# Altium footprint library Sigma_Library.PcbLib: 125 footprints (part 4 of 8)
Each footprint in its own frame and in the unit in brackets; x right, y up, seen from the top. Pads: shape width x height; smd on the part's side, far side on the other; paste and mask are expansions set on the pad; w line width, h text height; cw(c..) or ccw(c..) is an arc to the next point about the centre after c.
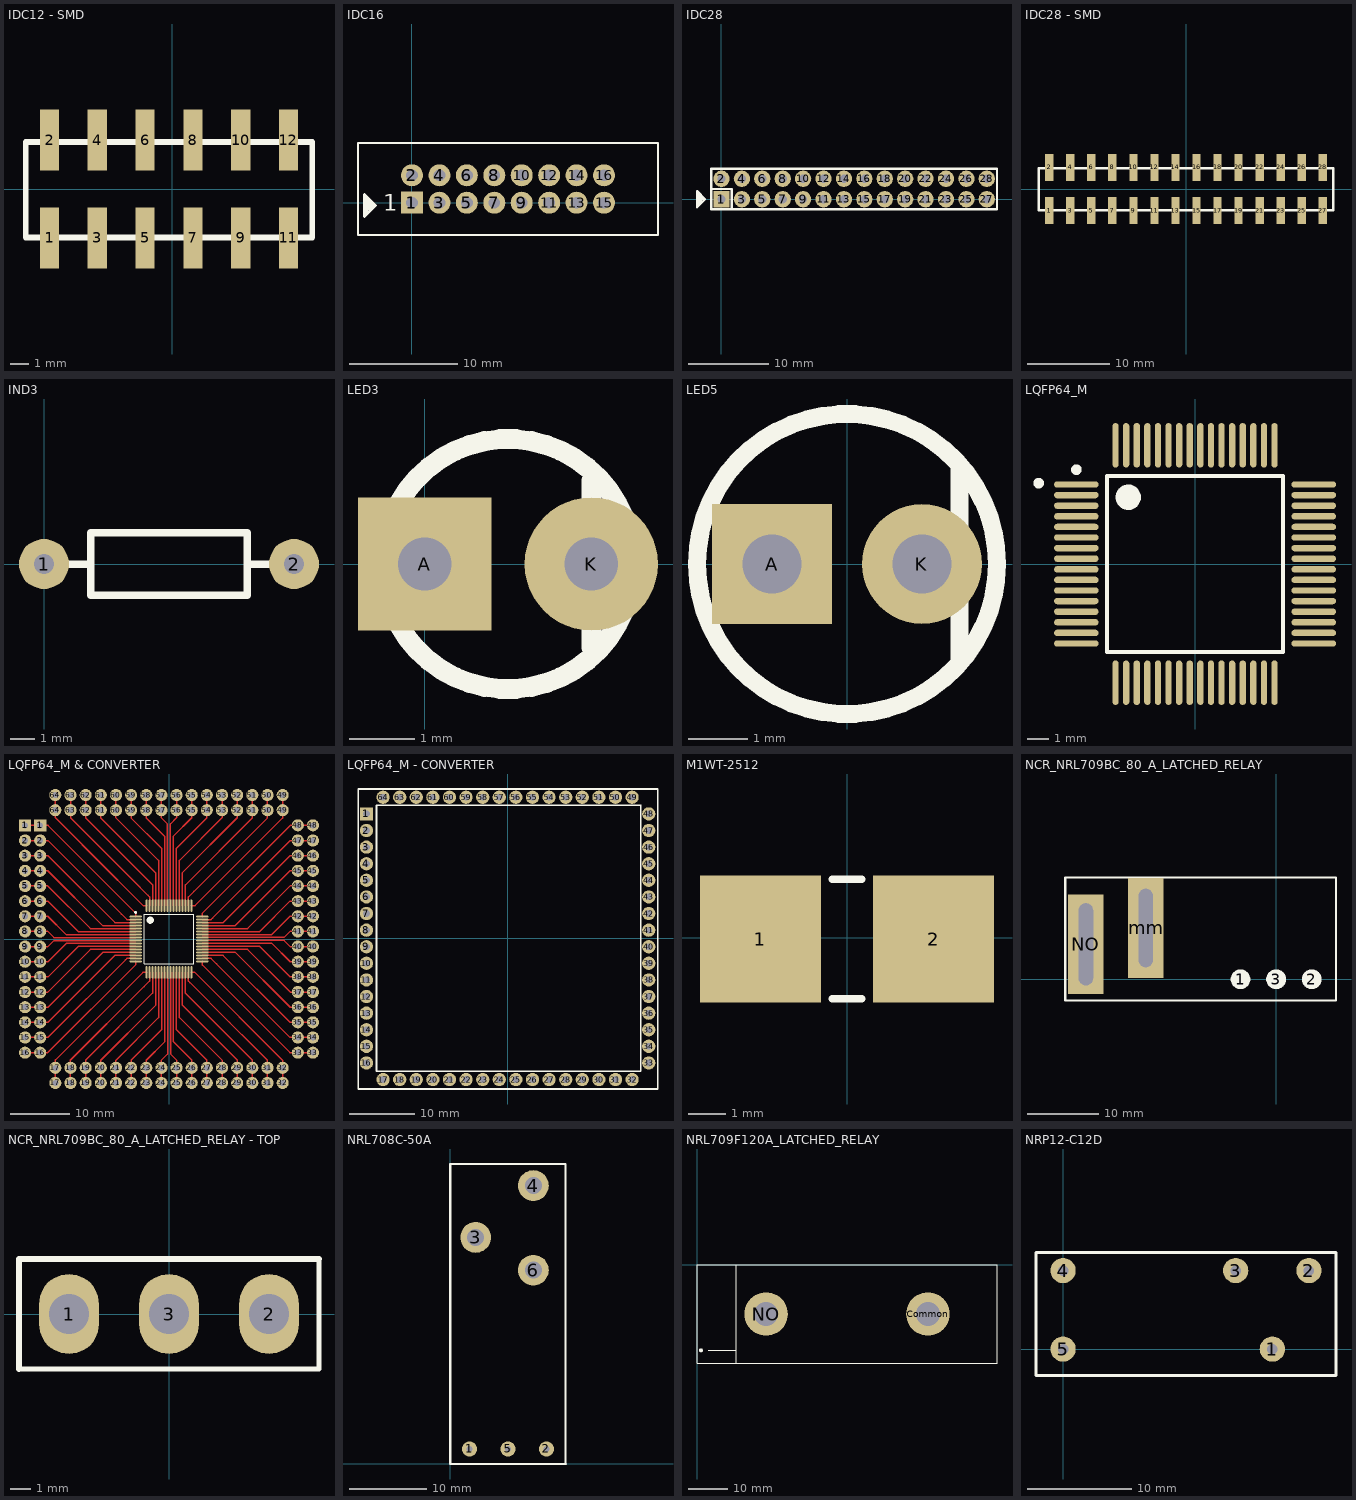
[diagram p3: the footprints below, top view; thin cyan lines are the x and y axes]

## IDC12 - SMD [mm]
pads (12):
  rect 1.02x3.25 smd: 1(-6.53,-2.603) 2(-6.53,2.603) 3(-3.99,-2.603) 4(-3.99,2.603) 5(-1.45,-2.603) 6(-1.45,2.603) 7(1.09,-2.603) 8(1.09,2.603) 9(3.63,-2.603) 10(3.63,2.603) 11(6.17,-2.603) 12(6.17,2.603)
Top Overlay:
  lines w0.305: -7.8,-2.581 -7.8,2.499 7.44,2.499 7.44,-2.581 -7.8,-2.581
3D body "c-5-146492-6-c-3d.stp": height 1.75, standoff -19, extent -7.544,-2.184 7.29,2.692

## IDC16 [mil]
pads (16):
  rect 80x80 hole 43.31: 1(0,0)
  round 80 hole 43.31: 2(0,100) 3(100,0) 4(100,100) 5(200,0) 6(200,100) 7(300,0) 8(300,100) 9(400,0) 10(400,100) 11(500,0) 12(500,100) 13(600,0) 14(600,100) 15(700,0) 16(700,100)
Top Overlay:
  lines w7.87: -196.85,-118.11 -196.85,218.11 896.85,218.11 896.85,-118.11 -196.85,-118.11
  lines w10: -163.11,-35 -163.11,15 ; -153.11,-25 -153.11,5 ; -143.11,-15 -143.11,-5 ; -173.11,-50 -133.11,-10 -173.11,30 -173.11,-50
  text "1" at -105,-30 h60
3D body "DS1013-16SSiB.stp": height 366.14, standoff -122.05, extent -205.51,-123.22 905.52,235.04

## IDC28 [mil]
pads (28):
  rect 80x80 hole 40: 1(0,0)
  round 80 hole 40: 2(0,100) 3(100,0) 4(100,100) 5(200,0) 6(200,100) 7(300,0) 8(300,100) 9(400,0) 10(400,100) 11(500,0) 12(500,100) 13(600,0) 14(600,100) 15(700,0) 16(700,100) 17(800,0) 18(800,100) 19(900,0) 20(900,100) 21(1000,0) 22(1000,100) 23(1100,0) 24(1100,100) 25(1200,0) 26(1200,100) 27(1300,0) 28(1300,100)
Top Overlay:
  lines w10: -110,-25 -110,25 ; -100,-15 -100,15 ; -90,-5 -90,5 ; -120,-40 -80,0 -120,40 -120,-40
  lines w12: -50,50 50,50 50,-50 ; -50,-50 1350,-50 1350,150 -50,150 -50,-50

## IDC28 - SMD [mm]
pads (28):
  rect 1.02x3.25 smd: 1(-16.51,-2.603) 2(-16.51,2.603) 3(-13.97,-2.603) 4(-13.97,2.603) 5(-11.43,-2.603) 6(-11.43,2.603) 7(-8.89,-2.603) 8(-8.89,2.603) 9(-6.35,-2.603) 10(-6.35,2.603) 11(-3.81,-2.603) 12(-3.81,2.603) 13(-1.27,-2.603) 14(-1.27,2.603) 15(1.27,-2.603) 16(1.27,2.603) 17(3.81,-2.603) 18(3.81,2.603) 19(6.35,-2.603) 20(6.35,2.603) 21(8.89,-2.603) 22(8.89,2.603) 23(11.43,-2.603) 24(11.43,2.603) 25(13.97,-2.603) 26(13.97,2.603) 27(16.51,-2.603) 28(16.51,2.603)
Top Overlay:
  lines w0.305: -17.78,-2.581 -17.78,2.499 17.78,2.499 17.78,-2.581 -17.78,-2.581
3D body "c-1-146492-4-c-3d.stp": height 19, standoff -1.75, extent -17.196,-2.438 17.958,2.439

## IND3 [mil]
pads (2):
  round 80 hole 32: 1(0,0) 2(400,0)
Top Overlay:
  lines w12: 0,0 75,0 ; 325,0 400,0 ; 75,-50 325,-50 325,50 75,50 75,-50
3D body "RES-0.25W-H-CF.stp": height 106.3, standoff -98.43, extent -10.82,-50.18 410.74,52.18

## LED3 [mil]
pads (2):
  rect 80x80 hole 32: A(0,0)
  round 80 hole 32: K(100,0)
Top Overlay:
  circle w12: c50,0 r75
  lines w12: 100,-50 100,50
3D body "LED_D3.0mm_RED.step": height 208.66, standoff -236.22, extent -25.59,-75.58 109.85,75.58

## LED5 [mil]
pads (2):
  rect 80x80 hole 39.37: A(-50,0)
  round 80 hole 39.37: K(50,0)
Top Overlay:
  circle w12: c0,0 r100
  lines w12: 75,-64 75,64
3D body "LED_gelb.step": height 354.33, standoff -1102.36, extent -108.27,-108.27 108.26,108.26

## LQFP64_M [mm] "Thin QFP, 64-Leads, Body 10x10mm, Pitch 0.5mm, IPC Low Density"
height 1.6
pads (64):
  oval 2.1x0.3 smd: 1(-5.6,3.75) 2(-5.6,3.25) 3(-5.6,2.75) 4(-5.6,2.25) 5(-5.6,1.75) 6(-5.6,1.25) 7(-5.6,0.75) 8(-5.6,0.25) 9(-5.6,-0.25) 10(-5.6,-0.75) 11(-5.6,-1.25) 12(-5.6,-1.75) 13(-5.6,-2.25) 14(-5.6,-2.75) 15(-5.6,-3.25) 16(-5.6,-3.75) 33(5.6,-3.75) 34(5.6,-3.25) 35(5.6,-2.75) 36(5.6,-2.25) 37(5.6,-1.75) 38(5.6,-1.25) 39(5.6,-0.75) 40(5.6,-0.25) 41(5.6,0.25) 42(5.6,0.75) 43(5.6,1.25) 44(5.6,1.75) 45(5.6,2.25) 46(5.6,2.75) 47(5.6,3.25) 48(5.6,3.75)
  oval 0.3x2.1 smd: 17(-3.75,-5.6) 18(-3.25,-5.6) 19(-2.75,-5.6) 20(-2.25,-5.6) 21(-1.75,-5.6) 22(-1.25,-5.6) 23(-0.75,-5.6) 24(-0.25,-5.6) 25(0.25,-5.6) 26(0.75,-5.6) 27(1.25,-5.6) 28(1.75,-5.6) 29(2.25,-5.6) 30(2.75,-5.6) 31(3.25,-5.6) 32(3.75,-5.6) 49(3.75,5.6) 50(3.25,5.6) 51(2.75,5.6) 52(2.25,5.6) 53(1.75,5.6) 54(1.25,5.6) 55(0.75,5.6) 56(0.25,5.6) 57(-0.25,5.6) 58(-0.75,5.6) 59(-1.25,5.6) 60(-1.75,5.6) 61(-2.25,5.6) 62(-2.75,5.6) 63(-3.25,5.6) 64(-3.75,5.6)
Top Overlay:
  circle w0.6: c-3.15,3.15 r0.3
  circle w0.25: c-5.6,4.45 r0.125
  circle w0.25: c-7.378,3.815 r0.125
  lines w0.2: -4.15,-4.15 4.15,-4.15 4.15,4.15 -4.15,4.15 -4.15,-4.15
3D body: height 10, standoff 0, extent -4.191,-4.191 4.191,4.191

## LQFP64_M & CONVERTER [mil] "Arm_With_Converter"
pads (192):
  rect 80x80 hole 40: 1(-950,750) 1(-850,750)
  oval 82.68x11.81 smd: 1(-220.47,147.64) 2(-220.47,127.95) 3(-220.47,108.27) 4(-220.47,88.58) 5(-220.47,68.9) 6(-220.47,49.21) 7(-220.47,29.53) 8(-220.47,9.84) 9(-220.47,-9.84) 10(-220.47,-29.53) 11(-220.47,-49.21) 12(-220.47,-68.9) 13(-220.47,-88.58) 14(-220.47,-108.27) 15(-220.47,-127.95) 16(-220.47,-147.64) 33(220.47,-147.64) 34(220.47,-127.95) 35(220.47,-108.27) 36(220.47,-88.58) 37(220.47,-68.9) 38(220.47,-49.21) 39(220.47,-29.53) 40(220.47,-9.84) 41(220.47,9.84) 42(220.47,29.53) 43(220.47,49.21) 44(220.47,68.9) 45(220.47,88.58) 46(220.47,108.27) 47(220.47,127.95) 48(220.47,147.64)
  round 80 hole 40: 2(-950,650) 2(-850,650) 3(-950,550) 3(-850,550) 4(-950,450) 4(-850,450) 5(-950,350) 5(-850,350) 6(-950,250) 6(-850,250) 7(-950,150) 7(-850,150) 8(-950,50) 8(-850,50) 9(-950,-50) 9(-850,-50) 10(-950,-150) 10(-850,-150) 11(-950,-250) 11(-850,-250) 12(-950,-350) 12(-850,-350) 13(-950,-450) 13(-850,-450) 14(-950,-550) 14(-850,-550) 15(-950,-650) 15(-850,-650) 16(-950,-750) 16(-850,-750) 17(-750,-950) 17(-750,-850) 18(-650,-950) 18(-650,-850) 19(-550,-950) 19(-550,-850) 20(-450,-950) 20(-450,-850) 21(-350,-950) 21(-350,-850) 22(-250,-950) 22(-250,-850) 23(-150,-950) 23(-150,-850) 24(-50,-950) 24(-50,-850) 25(50,-950) 25(50,-850) 26(150,-950) 26(150,-850) 27(250,-950) 27(250,-850) 28(350,-950) 28(350,-850) 29(450,-950) 29(450,-850) 30(550,-950) 30(550,-850) 31(650,-950) 31(650,-850) 32(750,-950) 32(750,-850) 33(850,-750) 33(950,-750) 34(850,-650) 34(950,-650) 35(850,-550) 35(950,-550) 36(850,-450) 36(950,-450) 37(850,-350) 37(950,-350) 38(850,-250) 38(950,-250) 39(850,-150) 39(950,-150) 40(850,-50) 40(950,-50) 41(850,50) 41(950,50) 42(850,150) 42(950,150) 43(850,250) 43(950,250) 44(850,350) 44(950,350) 45(850,450) 45(950,450) 46(850,550) 46(950,550) 47(850,650) 47(950,650) 48(850,750) 48(950,750) 49(750,850) 49(750,950) 50(650,850) 50(650,950) 51(550,850) 51(550,950) 52(450,850) 52(450,950) 53(350,850) 53(350,950) 54(250,850) 54(250,950) 55(150,850) 55(150,950) 56(50,850) 56(50,950) 57(-50,850) 57(-50,950) 58(-150,850) 58(-150,950) 59(-250,850) 59(-250,950) 60(-350,850) 60(-350,950) 61(-450,850) 61(-450,950) 62(-550,850) 62(-550,950) 63(-650,850) 63(-650,950) 64(-750,850) 64(-750,950)
  oval 11.81x82.68 smd: 17(-147.64,-220.47) 18(-127.95,-220.47) 19(-108.27,-220.47) 20(-88.58,-220.47) 21(-68.9,-220.47) 22(-49.21,-220.47) 23(-29.53,-220.47) 24(-9.84,-220.47) 25(9.84,-220.47) 26(29.53,-220.47) 27(49.21,-220.47) 28(68.9,-220.47) 29(88.58,-220.47) 30(108.27,-220.47) 31(127.95,-220.47) 32(147.64,-220.47) 49(147.64,220.47) 50(127.95,220.47) 51(108.27,220.47) 52(88.58,220.47) 53(68.9,220.47) 54(49.21,220.47) 55(29.53,220.47) 56(9.84,220.47) 57(-9.84,220.47) 58(-29.53,220.47) 59(-49.21,220.47) 60(-68.9,220.47) 61(-88.58,220.47) 62(-108.27,220.47) 63(-127.95,220.47) 64(-147.64,220.47)
Top Layer:
  lines w10: -950,-750 -850,-750 -799.61,-750 -220.47,-170.87 -220.47,-147.64 ; -950,-650 -850,-650 -800,-650 -277.95,-127.95 ; -950,-550 -850,-550 -799.21,-550 -357.48,-108.27 -220.47,-108.27 ; -950,-450 -850,-450 -798.43,-450 -437.01,-88.58 -220.47,-88.58 ; -950,-350 -850,-350 -799.21,-350 -518.11,-68.9 -220.47,-68.9 ; -950,-250 -850,-250 -799.21,-250 -598.43,-49.21 -220.47,-49.21 ; -950,-150 -850,-150 -798.82,-150 -678.35,-29.53 -220.47,-29.53 ; -950,150 -850,150 -800,150 -679.53,29.53 -220.47,29.53 ; -950,250 -850,250 -800,250 -599.21,49.21 -220.47,49.21 ; -950,350 -850,350 -800,350 -518.9,68.9 -220.47,68.9 ; -950,450 -850,450 -800,450 -438.58,88.58 -220.47,88.58 ; -950,550 -850,550 -798.82,550 -357.09,108.27 -220.47,108.27 ; -950,650 -850,650 -799.21,650 -313.78,164.57 -277.17,127.95 -220.47,127.95 ; -950,750 -850,750 -798.43,750 -220.47,172.05 -220.47,147.64 ; -750,-948.82 -750,-850 -750,-798.43 -172.05,-220.47 -147.64,-220.47 ; -750,950 -750,850 -750,799.61 ; -650,950.39 -650,950 -650,850 -650,800 ; -550,-950.79 -550,-798.82 -108.27,-357.09 -108.27,-220.47 ; -550,950 -550,850 -550,799.21 -108.27,357.48 -108.27,220.47 ; -450,-950.39 -450,-950 -450,-850 -450,-800 -88.58,-438.58 -88.58,-220.47 ; -450,950 -450,850 -450,798.43 -88.58,437.01 -88.58,220.47 ; -350,950 -350,850 -350,799.21 -68.9,518.11 -68.9,220.47 ; -287.8,-137.8 -277.95,-127.95 ; -250,-950.79 -250,-950 -250,-850 -250,-800.39 ; -250,-800 -49.21,-599.21 -49.21,-220.47 ; -250,950 -250,850 -250,799.21 -49.21,598.43 -49.21,220.47 ; -220.87,9.45 -759.05,9.45 -799.21,49.61 ; -150,-950.39 -150,-950 -150,-850 -150,-800 -29.53,-679.53 -29.53,-220.47 ; -150,950 -150,850 -150,798.82 -29.53,678.35 ; -147.64,220.47 -170.87,220.47 ; -127.95,-220.47 -127.95,-277.17 -164.57,-313.78 -651.18,-800.39 ; -127.95,220.47 -127.95,277.95 ; -68.9,-220.47 -68.9,-518.9 -351.18,-801.18 ; -50,950 -50.39,949.61 ; -45.28,694.09 -29.53,678.35 ; -29.53,220.47 -29.53,678.35 ; -9.84,220.47 -10.24,220.87 -10.24,759.06 -50.39,799.21 ; -9.45,-220.87 -9.45,-759.05 -49.61,-799.21 ; 9.84,220.47 9.45,220.87 9.45,759.06 ; 29.53,-220.47 29.53,-678.35 150,-798.82 150,-850 150,-949.21 ; 29.53,220.47 29.53,679.53 150,800 150,850 150,950 150,950.39 ; 49.21,-220.47 49.21,-598.43 248.82,-798.03 ; 49.21,220.47 49.21,599.21 250,800 250,850 250,950 250,950.39 ; 49.61,799.21 9.45,759.06 ; 50,-949.61 50,-850 50,-798.82 10.24,-759.06 ; 50,950 50,850 50,799.61 9.45,759.06 ; 68.9,-220.47 68.9,-518.11 350,-799.21 ; 68.9,220.47 68.9,518.9 350,800 350,850 350,950 350,950.39 ; 88.58,-220.47 88.58,-437.01 450,-798.43 450,-850 450,-948.82 ; 88.58,220.47 88.58,438.58 450,800 450,850 450,950 450,950.39 ; 108.27,-220.47 108.27,-357.48 548.82,-798.03 ; 108.27,220.47 108.27,357.09 550,798.82 550,850 550,949.21 ; 127.95,220.47 127.95,277.17 164.57,313.78 650,799.21 650,850 650,949.61 ; 147.64,-220.47 170.87,-220.47 750,-799.61 750,-850 750,-950 ; 147.64,220.47 172.05,220.47 750,798.43 750,850 750,948.82 ; 220.47,-147.64 220.47,-172.05 798.43,-750 850,-750 948.82,-750 ; 220.47,-127.95 277.17,-127.95 313.78,-164.57 799.21,-650 850,-650 949.61,-650 ; 220.47,-108.27 357.09,-108.27 798.82,-550 850,-550 949.21,-550 ; 220.47,-88.58 438.58,-88.58 800,-450 850,-450 950,-450 950.39,-450 ; 220.47,-68.9 518.9,-68.9 800,-350 850,-350 950,-350 950.39,-350 ; 220.47,-49.21 599.21,-49.21 800,-250 850,-250 950,-250 950.39,-250 ; 220.47,-29.53 679.53,-29.53 800,-150 850,-150 950,-150 950.39,-150 ; 220.47,29.53 678.35,29.53 798.82,150 850,150 949.21,150 ; 220.47,49.21 598.43,49.21 799.21,250 850,250 949.61,250 ; 220.47,68.9 518.11,68.9 799.21,350 850,350 949.61,350 ; 220.47,88.58 437.01,88.58 798.43,450 850,450 948.82,450 ; 220.47,108.27 357.48,108.27 799.21,550 850,550 949.61,550 ; 220.47,147.64 220.47,170.87 799.61,750 850,750 950,750 ; 220.87,-9.45 759.06,-9.45 799.21,-49.61 ; 287.8,137.8 277.95,127.95 ; 350,-949.21 350,-850 350,-799.21 ; 350,-798.82 350,-799.21 ; 650,-950.39 650,-950 650,-850 650,-800 ; 950.39,650 950,650 850,650 800,650 277.95,127.95 ; -950.39,49.61 -950,49.61 ; -950.39,49.61 -950,49.61 ; -950.39,49.61 -950,49.61 ; -950.39,49.61 -950,49.61 ; -950,49.61 -850,49.61 ; -950,49.61 -850,49.61 ; -950,49.61 -850,49.61 ; -950,49.61 -850,49.61 ; -949.61,-50.39 -850,-50.39 ; -949.61,-50.39 -850,-50.39 ; -949.61,-50.39 -850,-50.39 ; -949.61,-50.39 -850,-50.39 ; -850,-50.39 -799.21,-50.39 ; -850,-50.39 -799.21,-50.39 ; -850,-50.39 -799.21,-50.39 ; -850,-50.39 -799.21,-50.39 ; -850,49.61 -799.21,49.61 ; -850,49.61 -799.21,49.61 ; -850,49.61 -799.21,49.61 ; -850,49.61 -799.21,49.61 ; -799.21,-50.39 -759.06,-10.24 ; -759.06,-10.24 -220.47,-10.24 ; -759.06,-10.24 -220.47,-10.24 ; -759.06,-10.24 -220.08,-10.24 ; -759.06,-10.24 -220.47,-10.24 ; -750,799.61 -647.7,697.3 ; -750,799.61 -647.7,697.3 ; -750,799.61 -170.87,220.47 ; -750,799.61 -647.7,697.3 ; -651.18,-948.82 -651.18,-850 ; -651.18,-948.82 -651.18,-850 ; -651.18,-948.82 -651.18,-850 ; -651.18,-948.82 -651.18,-850 ; -651.18,-850 -651.18,-800.39 ; -651.18,-850 -651.18,-800.39 ; -651.18,-850 -651.18,-800.39 ; -651.18,-850 -651.18,-800.39 ; -650,800 -547.5,697.5 ; -650,800 -547.5,697.5 ; -650,800 -547.5,697.5 ; -650,800 -547.5,697.5 ; -647.7,697.3 -500.2,549.8 ; -647.7,697.3 -500.2,549.8 ; -647.7,697.3 -500.2,549.8 ; -547.5,697.5 -400,550 ; -547.5,697.5 -400,550 ; -547.5,697.5 -400,550 ; -547.5,697.5 -400,550 ; -500.2,549.8 -170.87,220.47 ; -500.2,549.8 -170.87,220.47 ; -500.2,549.8 -170.87,220.47 ; -400,550 -237.5,387.5 ; -400,550 -237.5,387.5 ; -400,550 -237.5,387.5 ; -400,550 -237.5,387.5 ; -351.18,-948.82 -351.18,-850 ; -351.18,-948.82 -351.18,-850 ; -351.18,-948.82 -351.18,-850 ; -351.18,-948.82 -351.18,-850 ; -351.18,-850 -351.18,-801.18 ; -351.18,-850 -351.18,-801.18 ; -351.18,-850 -351.18,-801.18 ; -351.18,-850 -351.18,-801.18 ; -277.95,-127.95 -220.47,-127.95 -277.95,-127.95 ; -237.5,387.5 -137.8,287.8 ; -237.5,387.5 -137.8,287.8 ; -237.5,387.5 -137.8,287.8 ; -237.5,387.5 -137.8,287.8 ; -220.47,-10.24 -220.08,-10.24 ; -220.47,-10.24 -220.08,-10.24 ; -220.47,-10.24 -220.08,-10.24 ; -137.8,287.8 -127.95,277.95 ; -137.8,287.8 -127.95,277.95 ; -50.39,799.21 -50.39,850 ; -50.39,799.21 -50.39,850 ; -50.39,799.21 -50.39,850 ; -50.39,799.21 -50.39,850 ; -50.39,850 -50.39,949.61 ; -50.39,850 -50.39,949.61 ; -50.39,850 -50.39,949.61 ; -50.39,850 -50.39,949.61 ; -49.61,-949.61 -49.61,-850 ; -49.61,-949.61 -49.61,-850 ; -49.61,-949.61 -49.61,-850 ; -49.61,-949.61 -49.61,-850 ; -49.61,-850 -49.61,-799.21 ; -49.61,-850 -49.61,-799.21 ; -49.61,-850 -49.61,-799.21 ; -49.61,-850 -49.61,-799.21 ; 10.24,-759.06 10.24,-220.47 ; 10.24,-759.06 10.24,-220.47 ; 10.24,-759.06 10.24,-220.47 ; 10.24,-759.06 10.24,-220.08 ; 10.24,-220.47 10.24,-220.08 ; 10.24,-220.47 10.24,-220.08 ; 10.24,-220.47 10.24,-220.08 ; 127.95,-277.95 127.95,-220.47 127.95,-277.95 ; 127.95,-277.95 137.8,-287.8 ; 127.95,-277.95 137.8,-287.8 ; 137.8,-287.8 400.2,-550.2 ; 137.8,-287.8 400.2,-550.2 ; 137.8,-287.8 400.2,-550.2 ; 137.8,-287.8 400.2,-550.2 ; 220.08,10.24 220.47,10.24 ; 220.08,10.24 220.47,10.24 ; 220.08,10.24 759.06,10.24 ; 220.08,10.24 220.47,10.24 ; 220.47,10.24 759.06,10.24 ; 220.47,10.24 759.06,10.24 ; 220.47,10.24 759.06,10.24 ; 248.82,-947.24 248.82,-850 ; 248.82,-947.24 248.82,-850 ; 248.82,-947.24 248.82,-850 ; 248.82,-947.24 248.82,-850 ; 248.82,-850 248.82,-798.03 ; 248.82,-850 248.82,-798.03 ; 248.82,-850 248.82,-798.03 ; 248.82,-850 248.82,-798.03 ; 277.95,127.95 220.47,127.95 277.95,127.95 ; 400.2,-550.2 555.2,-705.2 ; 400.2,-550.2 555.2,-705.2 ; 400.2,-550.2 555.2,-705.2 ; 400.2,-550.2 555.2,-705.2 ; 548.82,-948.42 548.82,-850 ; 548.82,-948.42 548.82,-850 ; 548.82,-948.42 548.82,-850 ; 548.82,-948.42 548.82,-798.03 ; 548.82,-850 548.82,-798.03 ; 548.82,-850 548.82,-798.03 ; 548.82,-850 548.82,-798.03 ; 555.2,-705.2 650,-800 ; 555.2,-705.2 650,-800 ; 555.2,-705.2 650,-800 ; 555.2,-705.2 650,-800 ; 759.06,10.24 799.21,50.39 ; 799.21,-49.61 850,-49.61 ; 799.21,-49.61 850,-49.61 ; 799.21,-49.61 850,-49.61 ; 799.21,-49.61 850,-49.61 ; 799.21,50.39 850,50.39 ; 799.21,50.39 850,50.39 ; 799.21,50.39 850,50.39 ; 799.21,50.39 850,50.39 ; 850,-49.61 949.61,-49.61 ; 850,-49.61 949.61,-49.61 ; 850,-49.61 949.61,-49.61 ; 850,-49.61 949.61,-49.61 ; 850,50.39 949.61,50.39 ; 850,50.39 949.61,50.39 ; 850,50.39 949.61,50.39 ; 850,50.39 949.61,50.39
Top Overlay:
  circle w23.62: c-124.02,124.02 r11.81
  circle w9.84: c-220.47,175.2 r4.92
  lines w7.87: -163.39,-163.39 163.39,-163.39 163.39,163.39 -163.39,163.39 -163.39,-163.39
3D body: height 393.7, standoff 0, extent -1008.46,-1003.94 -792.71,794.1
3D body: height 393.7, standoff 0, extent -1009.06,793.11 800,1008.86
3D body: height 393.7, standoff 0, extent 784.06,-816.54 999.8,1009.45
3D body: height 393.7, standoff 0, extent -812.99,-1007.87 996.06,-792.13
3D body: height 393.7, standoff 196.85, extent -795.06,-792.52 778.35,792.13

## LQFP64_M - CONVERTER [mil] "Arm_Converter"
height 21.65
pads (64):
  rect 80x80 hole 40: 1(-850,750)
  round 80 hole 40: 2(-850,650) 3(-850,550) 4(-850,450) 5(-850,350) 6(-850,250) 7(-850,150) 8(-850,50) 9(-850,-50) 10(-850,-150) 11(-850,-250) 12(-850,-350) 13(-850,-450) 14(-850,-550) 15(-850,-650) 16(-850,-750) 17(-750,-850) 18(-650,-850) 19(-550,-850) 20(-450,-850) 21(-350,-850) 22(-250,-850) 23(-150,-850) 24(-50,-850) 25(50,-850) 26(150,-850) 27(250,-850) 28(350,-850) 29(450,-850) 30(550,-850) 31(650,-850) 32(750,-850) 33(850,-750) 34(850,-650) 35(850,-550) 36(850,-450) 37(850,-350) 38(850,-250) 39(850,-150) 40(850,-50) 41(850,50) 42(850,150) 43(850,250) 44(850,350) 45(850,450) 46(850,550) 47(850,650) 48(850,750) 49(750,850) 50(650,850) 51(550,850) 52(450,850) 53(350,850) 54(250,850) 55(150,850) 56(50,850) 57(-50,850) 58(-150,850) 59(-250,850) 60(-350,850) 61(-450,850) 62(-550,850) 63(-650,850) 64(-750,850)
Top Overlay:
  lines w10: 803,802 -790,802 -790,-801 803,-801 803,802 ; 803,802 803,802 ; -900,-907 905,-907 905,899 904,900 -900,900 -900,-907
3D body "Header1x2.STEP": height 333.79, standoff -98.49, extent -895,600 -795,800
3D body "Header1x2.STEP": height 333.79, standoff -98.49, extent -895,400 -795,600
3D body "Header1x2.STEP": height 333.79, standoff -98.49, extent -895,0 -795,200
3D body "Header1x2.STEP": height 333.79, standoff -98.49, extent -895,200 -795,400
3D body "Header1x2.STEP": height 333.79, standoff -98.49, extent -895,-600 -795,-400
3D body "Header1x2.STEP": height 333.79, standoff -98.49, extent -895,-800 -795,-600
3D body "Header1x2.STEP": height 333.79, standoff -98.49, extent -895,-400 -795,-200
3D body "Header1x2.STEP": height 333.79, standoff -98.49, extent -895,-200 -795,0
3D body "Header1x2.STEP": height 333.79, standoff -98.49, extent 0,805 200,905
3D body "Header1x2.STEP": height 333.79, standoff -98.49, extent 200,805 400,905
3D body "Header1x2.STEP": height 333.79, standoff -98.49, extent 600,805 800,905
3D body "Header1x2.STEP": height 333.79, standoff -98.49, extent 400,805 600,905
3D body "Header1x2.STEP": height 333.79, standoff -98.49, extent -400,805 -200,905
3D body "Header1x2.STEP": height 333.79, standoff -98.49, extent -200,805 0,905
3D body "Header1x2.STEP": height 333.79, standoff -98.49, extent -600,805 -400,905
3D body "Header1x2.STEP": height 333.79, standoff -98.49, extent -800,805 -600,905
3D body "Header1x2.STEP": height 333.79, standoff -98.49, extent 805,-200 905,0
3D body "Header1x2.STEP": height 333.79, standoff -98.49, extent 805,-400 905,-200
3D body "Header1x2.STEP": height 333.79, standoff -98.49, extent 805,-800 905,-600
3D body "Header1x2.STEP": height 333.79, standoff -98.49, extent 805,-600 905,-400
3D body "Header1x2.STEP": height 333.79, standoff -98.49, extent 805,200 905,400
3D body "Header1x2.STEP": height 333.79, standoff -98.49, extent 805,0 905,200
3D body "Header1x2.STEP": height 333.79, standoff -98.49, extent 805,400 905,600
3D body "Header1x2.STEP": height 333.79, standoff -98.49, extent 805,600 905,800
3D body "Header1x2.STEP": height 333.79, standoff -98.49, extent -200,-905 0,-805
3D body "Header1x2.STEP": height 333.79, standoff -98.49, extent -400,-905 -200,-805
3D body "Header1x2.STEP": height 333.79, standoff -98.49, extent -800,-905 -600,-805
3D body "Header1x2.STEP": height 333.79, standoff -98.49, extent -600,-905 -400,-805
3D body "Header1x2.STEP": height 333.79, standoff -98.49, extent 200,-905 400,-805
3D body "Header1x2.STEP": height 333.79, standoff -98.49, extent 0,-905 200,-805
3D body "Header1x2.STEP": height 333.79, standoff -98.49, extent 400,-905 600,-805
3D body "Header1x2.STEP": height 333.79, standoff -98.49, extent 600,-905 800,-805

## M1WT-2512 [mm] "Power SMD Resistor"
pads (2):
  rect 3.25x3.4 smd: 1(-2.325,-0.029) 2(2.325,-0.029)
Top Overlay:
  lines w0.2: -0.4,-1.629 0.4,-1.629 ; -0.4,1.571 0.4,1.571

## NCR_NRL709BC_80_A_LATCHED_RELAY [mm]
pads (5):
  round 2.8 on Top Overlay: 1(-5,0) 2(5,0) 3(0,0)
  rect 5x14 hole 2 slot 11 at 90 deg: Common(-18.3,7.2)
  rect 5x14 hole 2 slot 11.5 at 90 deg: NO(-26.7,4.9)
Top Overlay:
  lines w0.254: -29.6,-3 8.4,-3 8.4,14.3
  lines w0.305: -29.6,-3 -29.6,14.3 8.4,14.3
3D body "NRL709BC-3D.STEP": height 30.16, standoff -9.34, extent -29.652,-2.896 8.348,14.104

## NCR_NRL709BC_80_A_LATCHED_RELAY - TOP [mm]
pads (3):
  oval 3x4 hole 2: 1(-5,0) 2(5,0) 3(0,0)
Top Overlay:
  lines w0.254: -7.5,-2.76 7.5,-2.76 7.5,2.76
  lines w0.305: -7.5,-2.76 -7.5,2.76 7.5,2.76

## NRL708C-50A [mm] "50 A latch relay pcb mount"
pads (6):
  round 2 hole 0.8: 1(2.5,1.95) 2(12.5,1.95) 5(7.5,1.95)
  round 4 hole 2.2: 3(3.3,29.45) 4(10.8,36.2) 6(10.8,25.2)
Top Overlay:
  lines w0.254: 0,39 15,39 15,0
  lines w0.305: 0,39 0,0 15,0
3D body "708C50A.STEP": height 31.02, standoff -4.88, extent 0.025,0 15.025,39

## NRL709F120A_LATCHED_RELAY [mm]
pads (2):
  round 11 hole 6: Common(58.5,-12.5) NO(17.5,-12.5)
Top Overlay:
  circle w0.5: c0.991,-21.7 r0.25
  lines w0.254: 0,-25 76,-25 76,0 ; 2.87,-21.7 9.983,-21.7
  lines w0.305: 0,-25 0,0 76,0 ; 10,-25 10,0
3D body "709F120A-3D.STEP": height 49.67, standoff 6.67, extent -0.052,-25.197 75.948,0.003

## NRP12-C12D [mm]
pads (5):
  round 2.413 hole 1: 1(20,0) 2(23.5,7.5) 3(16.5,7.5) 4(0,7.5) 5(0,0)
Top Overlay:
  lines w0.305: -2.591,-2.54 -2.591,9.246 26.086,9.246 26.086,-2.54 -2.591,-2.54